# Altium footprint library 3.22-杂项.PcbLib: 199 footprints (part 1 of 15)
Each footprint in its own frame and in the unit in brackets; x right, y up, seen from the top. Pads: shape width x height; smd on the part's side, far side on the other; paste and mask are expansions set on the pad; w line width, h text height; cw(c..) or ccw(c..) is an arc to the next point about the centre after c.
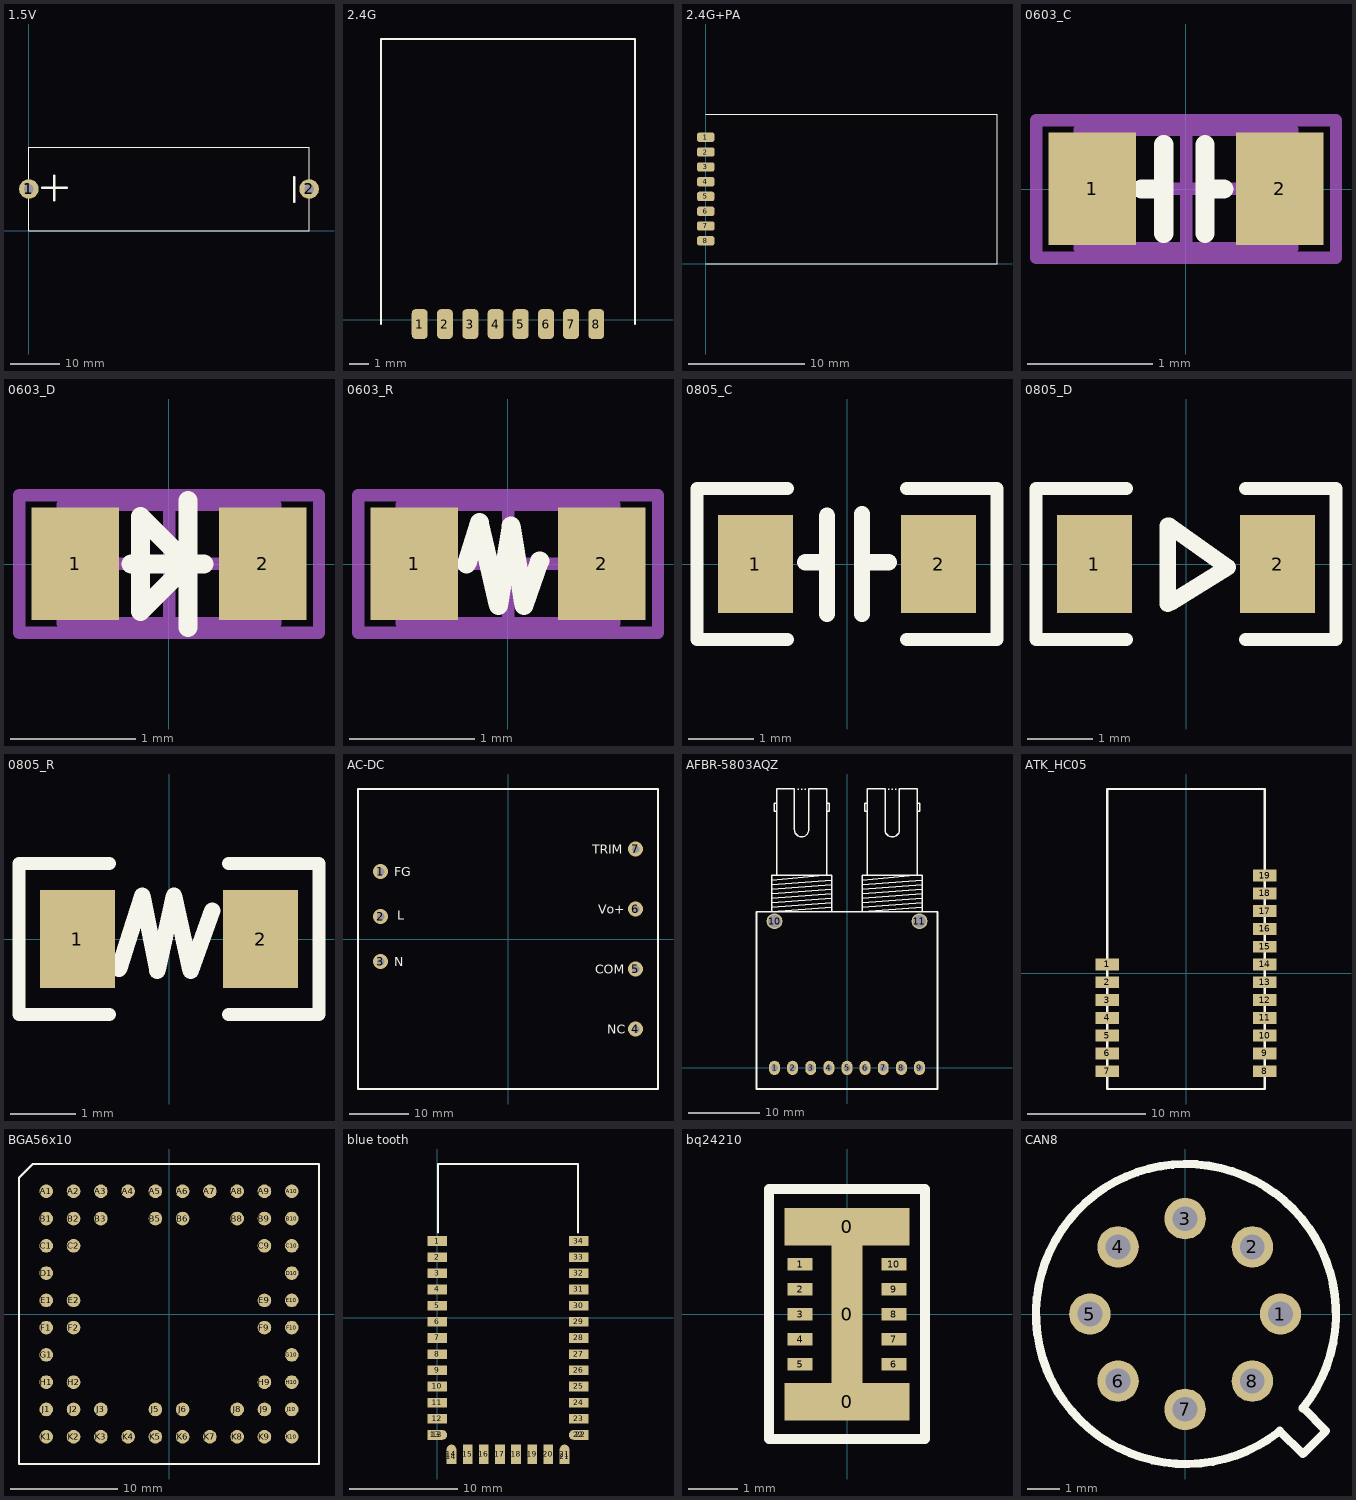
[diagram p0: the footprints below, top view; thin cyan lines are the x and y axes]

## 1.5V [mm]
pads (2):
  round 4 hole 2: 1(0,8.5) 2(57.1,8.5)
Top Overlay:
  lines w0.1: 0,0 57.099,0 57.099,17 0,17 0,0
  lines w0.5: 2.709,8.75 7.709,8.75 ; 5.207,6.248 5.207,11.248 ; 54.064,5.944 54.064,10.944

## 2.4G [mil]
pads (8):
  rrect50% 31.5x59.06 smd: 1(-566,-9) 2(-516,-9) 3(-465.5,-9) 4(-415.5,-9) 5(-366,-9) 6(-315.5,-9) 7(-266,-9) 8(-216,-9)
Top Overlay:
  lines w3.94: -642.94,-9 -642.94,556 -139,556 -139,-9
3D body: height 78.74, standoff 7.87, extent -643,-9 -139,544

## 2.4G+PA [mm] "欢迎光临https://shop463601444.taobao.com 掌柜ID：黄晶宝石"
pads (8):
  rrect50% 1.5x0.8 smd: 1(0,10.846) 2(0,9.576) 3(0,8.293) 4(0,7.023) 5(0,5.766) 6(0,4.483) 7(0,3.226) 8(0,1.956)
Top Overlay:
  lines w0.1: 0,0 25,0 25,12.8 0,12.8
3D body: height 2, standoff 0.2, extent 0,0 24.994,12.802

## 0603_C [mm]
pads (2):
  rect 0.7x0.9 smd: 1(-0.75,0) 2(0.75,0)
Top Overlay:
  lines w0.152: -0.356,0 -0.229,0 ; -0.178,-0.356 -0.178,0.356 ; 0.152,-0.356 0.152,0.356 ; 0.203,0 0.305,0
Mechanical 13:
  lines w0.1: -0.85,-0.475 -0.85,0.475 0.85,0.475 0.85,-0.475 -0.85,-0.475
Mechanical 15:
  lines w0.1: -0.475,0 0.475,0 ; 0,-0.475 0,0.475 ; -1.2,-0.55 -1.2,0.55 1.2,0.55 1.2,-0.55 -1.2,-0.55
3D body: height 0.9, standoff 0, extent -0.85,-0.475 0.85,0.475

## 0603_D [mm]
pads (2):
  rect 0.7x0.9 smd: 1(-0.75,0) 2(0.75,0)
Top Overlay:
  lines w0.152: -0.305,0 0.279,0 ; 0.127,-0.025 -0.229,-0.381 -0.229,0.381 0.127,0.025 ; 0.152,-0.508 0.152,0.508
Mechanical 13:
  lines w0.1: -0.85,-0.475 -0.85,0.475 0.85,0.475 0.85,-0.475 -0.85,-0.475
Mechanical 15:
  lines w0.1: -0.475,0 0.475,0 ; 0,-0.475 0,0.475 ; -1.2,-0.55 -1.2,0.55 1.2,0.55 1.2,-0.55 -1.2,-0.55
3D body: height 0.9, standoff 0, extent -0.85,-0.475 0.85,0.475

## 0603_R [mm]
pads (2):
  rect 0.7x0.9 smd: 1(-0.75,0) 2(0.75,0)
Top Overlay:
  lines w0.152: -0.33,0 -0.229,0.33 -0.076,-0.33 0.025,0.305 0.127,-0.33 0.254,0.025
Mechanical 13:
  lines w0.1: -0.85,-0.475 -0.85,0.475 0.85,0.475 0.85,-0.475 -0.85,-0.475
Mechanical 15:
  lines w0.1: -0.475,0 0.475,0 ; 0,-0.475 0,0.475 ; -1.2,-0.55 -1.2,0.55 1.2,0.55 1.2,-0.55 -1.2,-0.55
3D body: height 0.9, standoff 0, extent -0.85,-0.475 0.85,0.475

## 0805_C [mil]
pads (2):
  rect 45x59.05 smd: 1(-55,0) 2(55,0)
Top Overlay:
  lines w7.87: -35.75,-45.28 -90,-45.28 -90,45.28 -35.75,45.28 ; 35.75,-45.28 90,-45.28 90,45.28 35.75,45.28
  lines w9.84: -25,1 -12,1 ; -12,-30 -12,29 ; 9,-30 9,30 ; 9,1 25,1

## 0805_D [mil]
pads (2):
  rect 45x59.05 smd: 1(-55,0) 2(55,0)
Top Overlay:
  lines w7.87: -35.75,-45.28 -90,-45.28 -90,45.28 -35.75,45.28 ; 35.75,-45.28 90,-45.28 90,45.28 35.75,45.28
  lines w9.84: -11,-24 -11,23 ; -10,23 25,-2 -9,-23

## 0805_R [mil] "0805R, R2012-0401"
pads (2):
  rect 45x59.05 smd: 1(-55,0) 2(55,0)
Top Overlay:
  lines w7.87: -35.75,-45.28 -90,-45.28 -90,45.28 -35.75,45.28 ; 35.75,-45.28 90,-45.28 90,45.28 35.75,45.28
  lines w9.84: -30,-18 -16,26 -7,-19 3,26 13,-19 26,17

## AC-DC [mil] "电源模块AC/DC，50.8宽，50.8长 陕西雷能电子"
height 500
pads (7):
  round 100 hole 50: 1(-850,450) 2(-850,150) 3(-850,-150) 4(850,-600) 5(850,-200) 6(850,200) 7(850,600)
Top Overlay:
  lines w12: -1000,-1000 -1000,1000 1000,1000 1000,-1000 -1000,-1000
  text "Vo+" at 600,170 h60
  text "FG" at -760,420 h60
  text "L" at -740,130 h60
  text "TRIM" at 560,570 h60
  text "COM" at 580,-230 h60
  text "N" at -760,-180 h60
  text "NC" at 660,-630 h60

## AFBR-5803AQZ [mm] "光以太网"
height 14.8
pads (11):
  oval 1.524x2 hole 1: 1(-10.16,0) 2(-7.62,0) 3(-5.08,0) 4(-2.54,0) 5(0,0) 6(2.54,0) 7(5.08,0) 8(7.62,0) 9(10.16,0)
  round 2.2 hole 1.8: 10(-10.16,20.54) 11(10.16,20.54)
Top Overlay:
  lines w0.2: -10.559,23.15 -2.159,23.785 ; -10.559,23.785 -2.159,24.42 ; -10.559,24.42 -2.159,25.055 ; -10.559,25.055 -2.159,25.69 ; -10.559,25.69 -2.159,26.325 ; -10.559,26.325 -3.184,26.98 ; -10.55,22.515 -2.159,23.15 ; -9.859,35.985 -10.225,35.985 -10.225,37.085 -9.859,37.085 ; -7.359,33.378 ccw(c-6.359,33.378) -5.359,33.385 -5.359,39.08 -2.859,39.08 -2.859,26.98 -9.859,26.98 -9.859,39.08 -7.359,39.08 -7.359,33.378 ; -6.923,39.047 -6.796,39.047 ; -6.415,39.047 -6.288,39.047 ; -5.907,39.047 -5.78,39.047 ; -2.859,35.985 -2.478,35.985 -2.478,37.085 -2.859,37.085 ; -2.168,22.515 -10.559,21.88 ; 2.141,23.15 10.541,23.785 ; 2.141,23.785 10.541,24.42 ; 2.141,24.42 10.541,25.055 ; 2.141,25.055 10.541,25.69 ; 2.141,25.69 10.541,26.325 ; 2.141,26.325 9.516,26.98 ; 2.15,22.515 10.541,23.15 ; 2.841,35.985 2.475,35.985 2.475,37.085 2.841,37.085 ; 5.341,33.378 ccw(c6.341,33.378) 7.341,33.385 7.341,39.08 9.841,39.08 9.841,26.98 2.841,26.98 2.841,39.08 5.341,39.08 5.341,33.378 ; 5.777,39.047 5.904,39.047 ; 6.285,39.047 6.412,39.047 ; 6.793,39.047 6.92,39.047 ; 9.841,35.985 10.222,35.985 10.222,37.085 9.841,37.085 ; 10.532,22.515 2.141,21.88 ; -10.559,21.88 -10.559,26.98 -2.159,26.98 -2.159,21.88 -10.559,21.88 ; 2.141,21.88 2.141,26.98 10.541,26.98 10.541,21.88 2.141,21.88
  lines w0.254: -12.7,-2.965 12.7,-2.965 ; -12.7,-2.92 -12.7,21.88 12.7,21.88 12.7,-2.92

## ATK_HC05 [mm] "欢迎光临https://shop463601444.taobao.com 掌柜ID：黄晶宝石"
pads (19):
  rect 2x1 smd: 1(-6.65,0.75) 2(-6.65,-0.75) 3(-6.65,-2.25) 4(-6.65,-3.75) 5(-6.65,-5.25) 6(-6.65,-6.75) 7(-6.65,-8.25) 8(6.65,-8.25) 9(6.65,-6.75) 10(6.65,-5.25) 11(6.65,-3.75) 12(6.65,-2.25) 13(6.65,-0.75) 14(6.65,0.75) 15(6.65,2.25) 16(6.65,3.75) 17(6.65,5.25) 18(6.65,6.75) 19(6.65,8.25)
Top Overlay:
  lines w0.2: -6.65,-9.75 -6.65,15.55 6.65,15.55 6.65,-9.75 -6.65,-9.75

## BGA56x10 [mil]
pads (56):
  round 50 smd: A1(-450,450) A2(-350,450) A3(-250,450) A4(-150,450) A5(-50,450) A6(50,450) A7(150,450) A8(250,450) A9(350,450) A10(450,450) B1(-450,350) B2(-350,350) B3(-250,350) B5(-50,350) B6(50,350) B8(250,350) B9(350,350) B10(450,350) C1(-450,250) C2(-350,250) C9(350,250) C10(450,250) D1(-450,150) D10(450,150) E1(-450,50) E2(-350,50) E9(350,50) E10(450,50) F1(-450,-50) F2(-350,-50) F9(350,-50) F10(450,-50) G1(-450,-150) G10(450,-150) H1(-450,-250) H2(-350,-250) H9(350,-250) H10(450,-250) J1(-450,-350) J2(-350,-350) J3(-250,-350) J5(-50,-350) J6(50,-350) J8(250,-350) J9(350,-350) J10(450,-350) K1(-450,-450) K2(-350,-450) K3(-250,-450) K4(-150,-450) K5(-50,-450) K6(50,-450) K7(150,-450) K8(250,-450) K9(350,-450) K10(450,-450)
Top Overlay:
  lines w8: -550,-550 -550,500 -500,550 550,550 550,-550 -550,-550

## blue tooth [mm] "欢迎光临https://shop463601444.taobao.com 掌柜ID：黄晶宝石"
pads (38):
  rect 1.8x0.9 smd: 1(0,7.112) 2(0,5.612) 3(0,4.112) 4(0,2.612) 5(0,1.112) 6(0,-0.388) 7(0,-1.888) 8(0,-3.388) 9(0,-4.888) 10(0,-6.388) 11(0,-7.888) 12(0,-9.388) 23(13.1,-9.388) 24(13.1,-7.888) 25(13.1,-6.388) 26(13.1,-4.888) 27(13.1,-3.388) 28(13.1,-1.888) 29(13.1,-0.388) 30(13.1,1.112) 31(13.1,2.612) 32(13.1,4.112) 33(13.1,5.612) 34(13.1,7.112)
  rect 1.35x0.9 smd: 13(-0.225,-10.888) 22(13.325,-10.888)
  oval 1.8x0.9 smd: 13(0,-10.888) 22(13.1,-10.888)
  rect 0.9x1.35 smd: 14(1.3,-12.913) 21(11.8,-12.913)
  oval 0.9x1.8 smd: 14(1.3,-12.688) 21(11.8,-12.688)
  rect 0.9x1.8 smd: 15(2.8,-12.688) 16(4.3,-12.688) 17(5.8,-12.688) 18(7.3,-12.688) 19(8.8,-12.688) 20(10.3,-12.688)
Top Overlay:
  lines w0.152: 0.05,7.874 0.05,14.262 13.05,14.262 13.05,7.874

## bq24210 [mil]
pads (13):
  rect 100x30 smd mask+1: 0(0,-70) 0(0,70)
  rect 25x110 smd mask+1: 0(0,0)
  rect 20x10 smd mask+0.5: 1(-37.5,40) 2(-37.5,20) 3(-37.5,0) 4(-37.5,-20) 5(-37.5,-40) 6(37.5,-40) 7(37.5,-20) 8(37.5,0) 9(37.5,20) 10(37.5,40)
Top Overlay:
  lines w8: -62.5,-100 62.5,-100 62.5,100 -62.5,100 -62.5,-100

## CAN8 [mil]
pads (8):
  round 50 hole 30: 1(115,0) 2(81,81) 3(0,115) 4(-81,81) 5(-115,0) 6(-81,-81) 7(0,-115) 8(81,-81)
Top Overlay:
  lines w10: 112.43,-142.63 cw(c1,0) 141.66,-113.91 ; 114,-141 142,-169 170,-141 142,-113